# Altium footprint library ThroHoleCap.PcbLib: 81 footprints (part 6 of 6)
Each footprint in its own frame and in the unit in brackets; x right, y up, seen from the top. Pads: shape width x height; smd on the part's side, far side on the other; paste and mask are expansions set on the pad; w line width, h text height; cw(c..) or ccw(c..) is an arc to the next point about the centre after c.
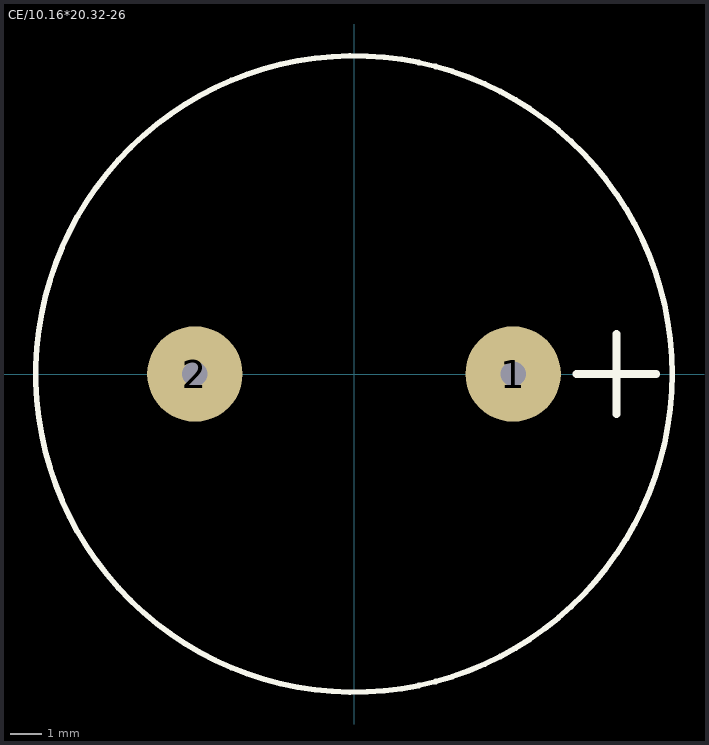
[diagram p5: the footprint, top view; thin cyan lines are the x and y axes]

## CE/10.16*20.32-26 [mil]
pads (2):
  round 120 hole 32: 1(200,0) 2(-200,0)
Top Overlay:
  circle w7: c0,0 r400
  lines w10: 280,0 380,0 ; 330,-50 330,50
3D body "User Library-ECEC2DP271BJ.STEP": height 1034.25, standoff 50, extent -439.08,-424.14 427.07,442